# Altium footprint library pcb_ConnectorGeneral.PcbLib: 111 footprints (part 1 of 7)
Each footprint in its own frame and in the unit in brackets; x right, y up, seen from the top. Pads: shape width x height; smd on the part's side, far side on the other; paste and mask are expansions set on the pad; w line width, h text height; cw(c..) or ccw(c..) is an arc to the next point about the centre after c.
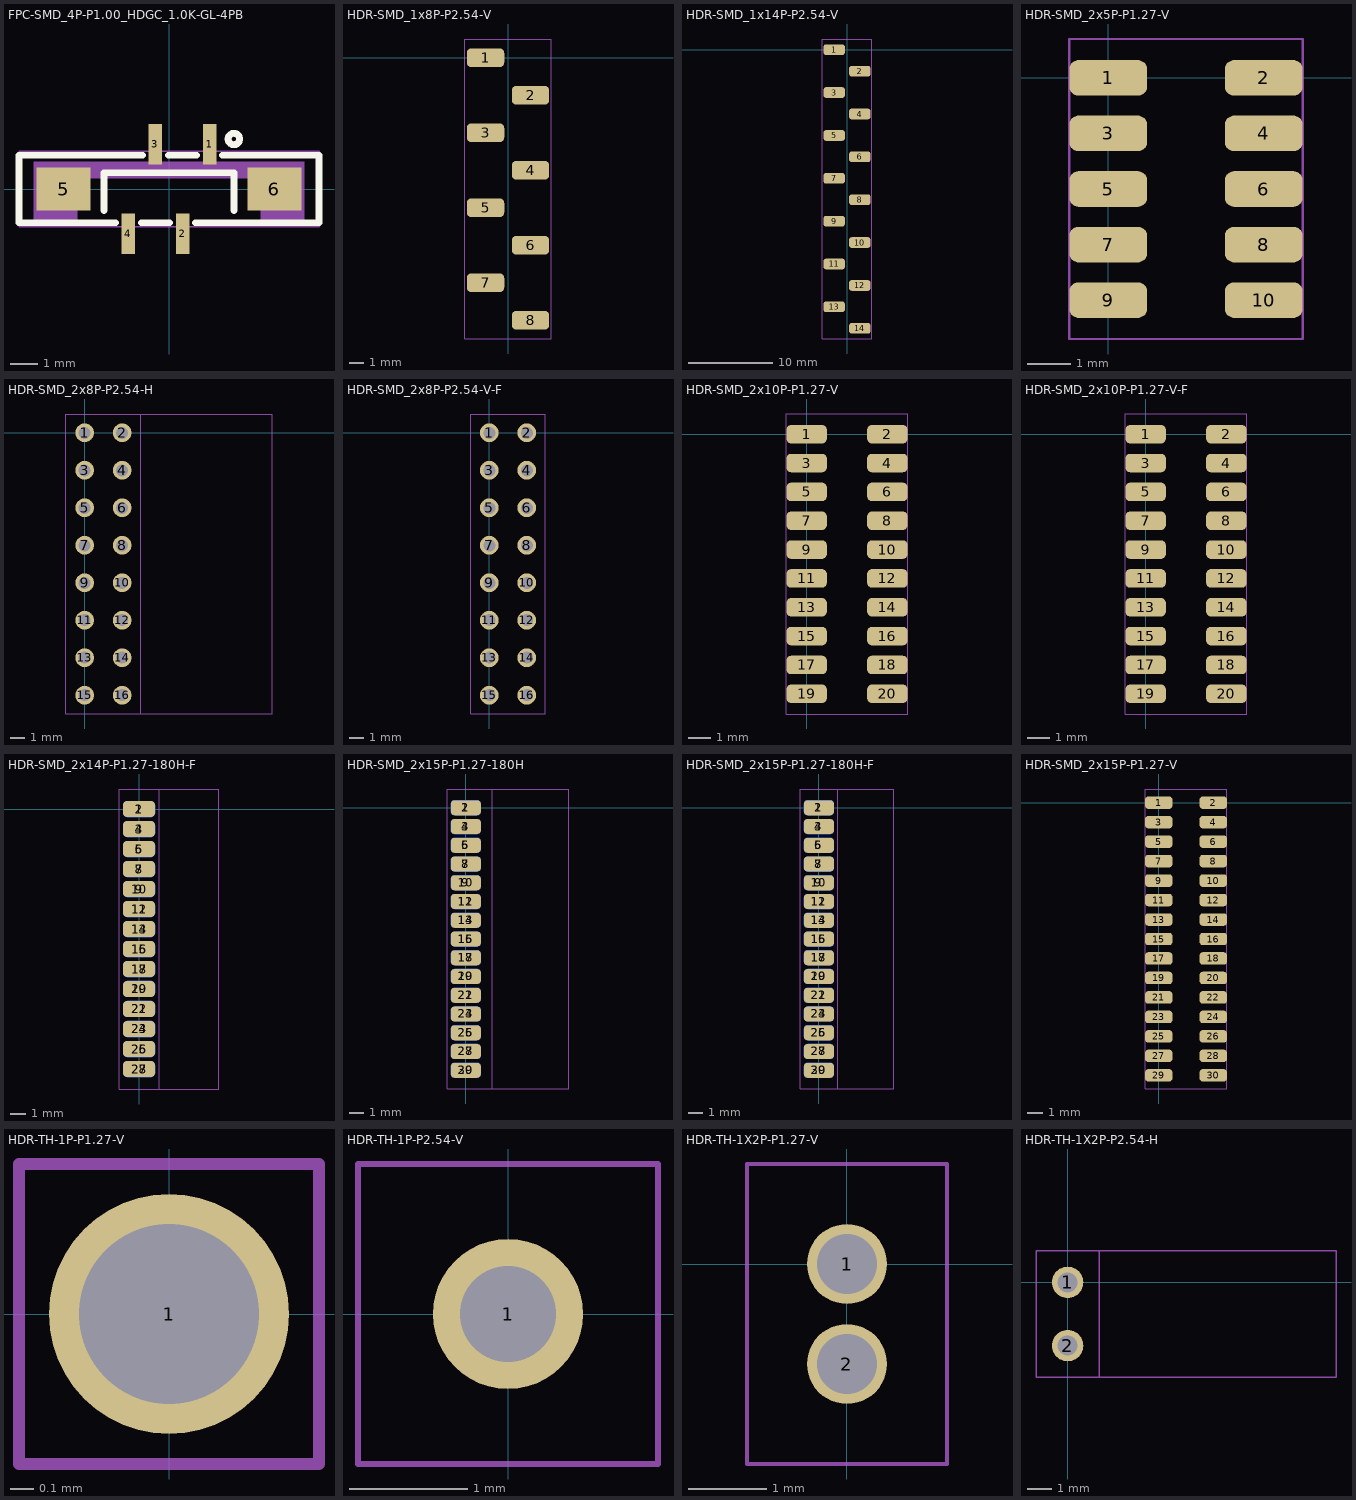
[diagram p0: the footprints below, top view; thin cyan lines are the x and y axes]

## FPC-SMD_4P-P1.00_HDGC_1.0K-GL-4PB [mm]
pads (6):
  rect 0.5x1.5 smd paste+0 mask+0.05: 1(1.5,1.65) 2(0.5,-1.65) 3(-0.5,1.65) 4(-1.5,-1.65)
  rect 2x1.6 smd paste+0 mask+0.05: 5(-3.9,0) 6(3.9,0)
Top Overlay:
  circle w0.254: c2.4,1.85 r0.212
  lines w0.254: -5.55,-1.251 -5.55,1.251 ; -5.55,-1.25 -1.981,-1.25 ; -5.55,1.25 -0.981,1.25 ; -2.4,-0.8 -2.4,0.6 2.4,0.6 2.4,-0.8 ; -1.019,-1.25 0.019,-1.25 ; -0.019,1.25 1.019,1.25 ; 0.981,-1.25 5.55,-1.25 5.55,1.25 1.981,1.25
Mechanical 6:
  region: 5,-1.2 3.4,-1.2 3.4,0.4 -3.4,0.4 -3.4,-1.2 -5,-1.2 -5,1 5,1
Mechanical 15:
  region: -1.625,-1.05 -1.375,-1.05 -1.375,-2.25 -1.625,-2.25
  region: 0.375,-1.05 0.625,-1.05 0.625,-2.25 0.375,-2.25
  region: 1.375,2.25 1.625,2.25 1.625,1.05 1.375,1.05
  region: -0.625,2.25 -0.375,2.25 -0.375,1.05 -0.625,1.05
  region: 3.1,0.6 4.7,0.6 4.7,-0.6 3.1,-0.6
  region: -4.7,0.6 -3.1,0.6 -3.1,-0.6 -4.7,-0.6
  lines w0.051: -5.55,-1.4 -5.55,1.4 5.55,1.4 5.55,-1.4 -5.55,-1.4
3D body "3D_PCB1_2025-04-14.step": height 5.48, standoff 0.08, extent -5.531,-2.123 5.569,2.377

## HDR-SMD_1x8P-P2.54-V [mil]
height 169.29
pads (8):
  rrect50% 100x50 smd: 1(-60,0) 2(60,-100) 3(-60,-200) 4(60,-300) 5(-60,-400) 6(60,-500) 7(-60,-600) 8(60,-700)
Mechanical 13:
  lines w2: -115,-750 115,-750 115,50 -115,50 -115,-750
Mechanical 14:
  lines w2: -115,-750 -115,50 115,50 115,-750 -115,-750
Mechanical 16:
  text ".Designator" at 0,0 h39.37
3D body "pin_header_a-sl254-eg-g08mp1.stp": height 386.46, standoff -0.94, extent -98.56,-746.07 98.29,53.93

## HDR-SMD_1x14P-P2.54-V [mil]
height 169.29
pads (14):
  rrect50% 100x50 smd: 1(-60,0) 2(60,-100) 3(-60,-200) 4(60,-300) 5(-60,-400) 6(60,-500) 7(-60,-600) 8(60,-700) 9(-60,-800) 10(60,-900) 11(-60,-1000) 12(60,-1100) 13(-60,-1200) 14(60,-1300)
Mechanical 13:
  lines w2: -115,-1350 -115,50 115,50 115,-1350 -115,-1350
Mechanical 14:
  lines w2: -115,-1350 115,-1350 115,50 -115,50 -115,-1350
Mechanical 16:
  text ".Designator" at 0,0 h39.37
3D body "pin_header_A-SL254-EG-G14MP1.stp": height 386.46, standoff -0.94, extent -98.42,-1350 98.43,50

## HDR-SMD_2x5P-P1.27-V [mil]
height 169.29
pads (10):
  rrect50% 70x32 smd: 1(0,0) 2(140,0) 3(0,-50) 4(140,-50) 5(0,-100) 6(140,-100) 7(0,-150) 8(140,-150) 9(0,-200) 10(140,-200)
Mechanical 13:
  lines w2: -35,-235 175,-235 175,35 -35,35 -35,-235
Mechanical 14:
  lines w2: -35,-235 175,-235 175,35 -35,35 -35,-235
Mechanical 16:
  text ".Designator" at 0,0 h39.37
3D body "pin_header_a-sl127-dg-g10mp1.stp": height 252.13, standoff 0.25, extent -38.35,-225 178.35,25

## HDR-SMD_2x8P-P2.54-H [mil]
height 169.29
pads (16):
  round 50 hole 32: 1(0,0) 2(100,0) 3(0,-100) 4(100,-100) 5(0,-200) 6(100,-200) 7(0,-300) 8(100,-300) 9(0,-400) 10(100,-400) 11(0,-500) 12(100,-500) 13(0,-600) 14(100,-600) 15(0,-700) 16(100,-700)
Mechanical 13:
  lines w2: -50,-750 -50,50 500,50 500,-750 -50,-750
Mechanical 14:
  lines w2: -50,-750 -50,50 150,50 150,-750 -50,-750
Mechanical 16:
  text ".Designator" at 0,0 h39.37
3D body "pin_header_awl254-da-g16d.stp": height 198.43, standoff -116.54, extent -10,-750 497.09,50

## HDR-SMD_2x8P-P2.54-V-F [mil]
height 169.29
pads (16):
  round 50 hole 32: 1(0,0) 2(100,0) 3(0,-100) 4(100,-100) 5(0,-200) 6(100,-200) 7(0,-300) 8(100,-300) 9(0,-400) 10(100,-400) 11(0,-500) 12(100,-500) 13(0,-600) 14(100,-600) 15(0,-700) 16(100,-700)
Mechanical 13:
  lines w2: -50,-750 150,-750 150,50 -50,50 -50,-750
Mechanical 14:
  lines w2: -50,-750 150,-750 150,50 -50,50 -50,-750
Mechanical 16:
  text ".Designator" at 0,0 h39.37
3D body "female_header_a-bl254-dg-g16d.stp": height 334.65, standoff -125.98, extent -48.42,-754.92 148.43,54.92

## HDR-SMD_2x10P-P1.27-V [mil]
height 169.29
pads (20):
  rrect50% 70x32 smd: 1(0,0) 2(140,0) 3(0,-50) 4(140,-50) 5(0,-100) 6(140,-100) 7(0,-150) 8(140,-150) 9(0,-200) 10(140,-200) 11(0,-250) 12(140,-250) 13(0,-300) 14(140,-300) 15(0,-350) 16(140,-350) 17(0,-400) 18(140,-400) 19(0,-450) 20(140,-450)
Mechanical 13:
  lines w2: -35,-485 -35,35 175,35 175,-485 -35,-485
Mechanical 14:
  lines w2: -35,-485 -35,35 175,35 175,-485 -35,-485
Mechanical 16:
  text ".Designator" at 0,0 h39.37
3D body "pin_header_a-sl127-dg-g20mp1.stp": height 252.13, standoff 0.25, extent -38.3,-475 178.31,25

## HDR-SMD_2x10P-P1.27-V-F [mil]
height 169.29
pads (20):
  rrect50% 70x32 smd: 1(0,0) 2(140,0) 3(0,-50) 4(140,-50) 5(0,-100) 6(140,-100) 7(0,-150) 8(140,-150) 9(0,-200) 10(140,-200) 11(0,-250) 12(140,-250) 13(0,-300) 14(140,-300) 15(0,-350) 16(140,-350) 17(0,-400) 18(140,-400) 19(0,-450) 20(140,-450)
Mechanical 13:
  lines w2: -35,-485 -35,35 175,35 175,-485 -35,-485
Mechanical 14:
  lines w2: -35,-485 -35,35 175,35 175,-485 -35,-485
Mechanical 16:
  text ".Designator" at 0,0 h39.37
3D body "female_header_a-bl127-dg-g20mp1.stp": height 185.29, standoff 8.13, extent -20.54,-482.88 160.56,32.87

## HDR-SMD_2x14P-P1.27-180H-F [mil]
height 169.29
pads (28):
  rrect50% 80x40 smd: 1(0,0) 3(0,-50) 5(0,-100) 7(0,-150) 9(0,-200) 11(0,-250) 13(0,-300) 15(0,-350) 17(0,-400) 19(0,-450) 21(0,-500) 23(0,-550) 25(0,-600) 27(0,-650)
  rrect50% 80x40 smd far side: 2(0,0) 4(0,-50) 6(0,-100) 8(0,-150) 10(0,-200) 12(0,-250) 14(0,-300) 16(0,-350) 18(0,-400) 20(0,-450) 22(0,-500) 24(0,-550) 26(0,-600) 28(0,-650)
Mechanical 13:
  lines w2: -50,-700 200,-700 200,50 -50,50 -50,-700
Mechanical 14:
  lines w2: -50,-700 50,-700 50,50 -50,50 -50,-700
Mechanical 16:
  text ".Designator" at 0,0 h39.37
3D body "female_header_a-bl127-dg-g28d.stp": height 40.02, standoff -82.02, extent -28.34,-682.87 200,32.87

## HDR-SMD_2x15P-P1.27-180H [mil]
height 169.29
pads (30):
  rrect50% 80x40 smd: 1(0,0) 3(0,-50) 5(0,-100) 7(0,-150) 9(0,-200) 11(0,-250) 13(0,-300) 15(0,-350) 17(0,-400) 19(0,-450) 21(0,-500) 23(0,-550) 25(0,-600) 27(0,-650) 29(0,-700)
  rrect50% 80x40 smd far side: 2(0,0) 4(0,-50) 6(0,-100) 8(0,-150) 10(0,-200) 12(0,-250) 14(0,-300) 16(0,-350) 18(0,-400) 20(0,-450) 22(0,-500) 24(0,-550) 26(0,-600) 28(0,-650) 30(0,-700)
Mechanical 13:
  lines w2: -50,-750 -50,50 275,50 275,-750 -50,-750
Mechanical 14:
  lines w2: -50,-750 -50,50 70,50 70,-750 -50,-750
Mechanical 16:
  text ".Designator" at 0,0 h39.37
3D body "pin_header_a-sl127-dg-g30d.stp": height 76.43, standoff -120.43, extent -36.22,-725 276.38,25

## HDR-SMD_2x15P-P1.27-180H-F [mil]
height 169.29
pads (30):
  rrect50% 80x40 smd: 1(0,0) 3(0,-50) 5(0,-100) 7(0,-150) 9(0,-200) 11(0,-250) 13(0,-300) 15(0,-350) 17(0,-400) 19(0,-450) 21(0,-500) 23(0,-550) 25(0,-600) 27(0,-650) 29(0,-700)
  rrect50% 80x40 smd far side: 2(0,0) 4(0,-50) 6(0,-100) 8(0,-150) 10(0,-200) 12(0,-250) 14(0,-300) 16(0,-350) 18(0,-400) 20(0,-450) 22(0,-500) 24(0,-550) 26(0,-600) 28(0,-650) 30(0,-700)
Mechanical 13:
  lines w2: -50,-750 200,-750 200,50 -50,50 -50,-750
Mechanical 14:
  lines w2: -50,-750 50,-750 50,50 -50,50 -50,-750
Mechanical 16:
  text ".Designator" at 0,0 h39.37
3D body "female_header_a-bl127-dg-g30d.stp": height 40.02, standoff -82.02, extent -28.34,-732.87 200,32.87

## HDR-SMD_2x15P-P1.27-V [mil]
height 169.29
pads (30):
  rrect50% 70x32 smd: 1(0,0) 2(140,0) 3(0,-50) 4(140,-50) 5(0,-100) 6(140,-100) 7(0,-150) 8(140,-150) 9(0,-200) 10(140,-200) 11(0,-250) 12(140,-250) 13(0,-300) 14(140,-300) 15(0,-350) 16(140,-350) 17(0,-400) 18(140,-400) 19(0,-450) 20(140,-450) 21(0,-500) 22(140,-500) 23(0,-550) 24(140,-550) 25(0,-600) 26(140,-600) 27(0,-650) 28(140,-650) 29(0,-700) 30(140,-700)
Mechanical 13:
  lines w2: -35,-735 175,-735 175,35 -35,35 -35,-735
Mechanical 14:
  lines w2: -35,-735 175,-735 175,35 -35,35 -35,-735
Mechanical 16:
  text ".Designator" at 0,0 h39.37
3D body "pin_header_a-sl127-dg-g30mp1.stp": height 252.13, standoff 0.25, extent -38.3,-725 178.31,25

## HDR-TH-1P-P1.27-V [mil]
height 169.29
pads (1):
  round 40 hole 30: 1(0,0)
Mechanical 13:
  lines w2: -25,-25 -25,25 25,25 25,-25 -25,-25
Mechanical 14:
  lines w2: -25,-25 25,-25 25,25 -25,25 -25,-25
Mechanical 16:
  text ".Designator" at 0,0 h39.37

## HDR-TH-1P-P2.54-V [mil]
height 169.29
pads (1):
  round 50 hole 32: 1(0,0)
Mechanical 13:
  lines w2: -50,-50 -50,50 50,50 50,-50 -50,-50
Mechanical 14:
  lines w2: -50,-50 -50,50 50,50 50,-50 -50,-50
Mechanical 16:
  text ".Designator" at 0,0 h39.37

## HDR-TH-1X2P-P1.27-V [mil]
height 169.29
pads (2):
  round 40 hole 30: 1(0,0) 2(0,-50)
Mechanical 13:
  lines w2: -50,-100 -50,50 50,50 50,-100 -50,-100
Mechanical 14:
  lines w2: -50,-100 -50,50 50,50 50,-100 -50,-100
Mechanical 16:
  text ".Designator" at 0,0 h39.37
3D body "pin_header_a-sl127-eg-g02d.stp": height 210.24, standoff -102.36, extent -49.21,-75 49.22,25

## HDR-TH-1X2P-P2.54-H [mil]
height 169.29
pads (2):
  round 50 hole 32: 1(0,0) 2(0,-100)
Mechanical 13:
  lines w2: -50,-150 -50,50 425,50 425,-150 -50,-150
Mechanical 14:
  lines w2: -50,-150 50,-150 50,50 -50,50 -50,-150
Mechanical 16:
  text ".Designator" at 0,0 h39.37
3D body "pin_header_aw140-ea-g02g.stp": height 99.21, standoff -93.7, extent -15,-146.06 423.58,46.06